# Altium footprint library 3.22-杂项.PcbLib: 985 footprints (part 23 of 64)
Each footprint in its own frame and in the unit in brackets; x right, y up, seen from the top. Pads: shape width x height; smd on the part's side, far side on the other; paste and mask are expansions set on the pad; w line width, h text height; cw(c..) or ccw(c..) is an arc to the next point about the centre after c.
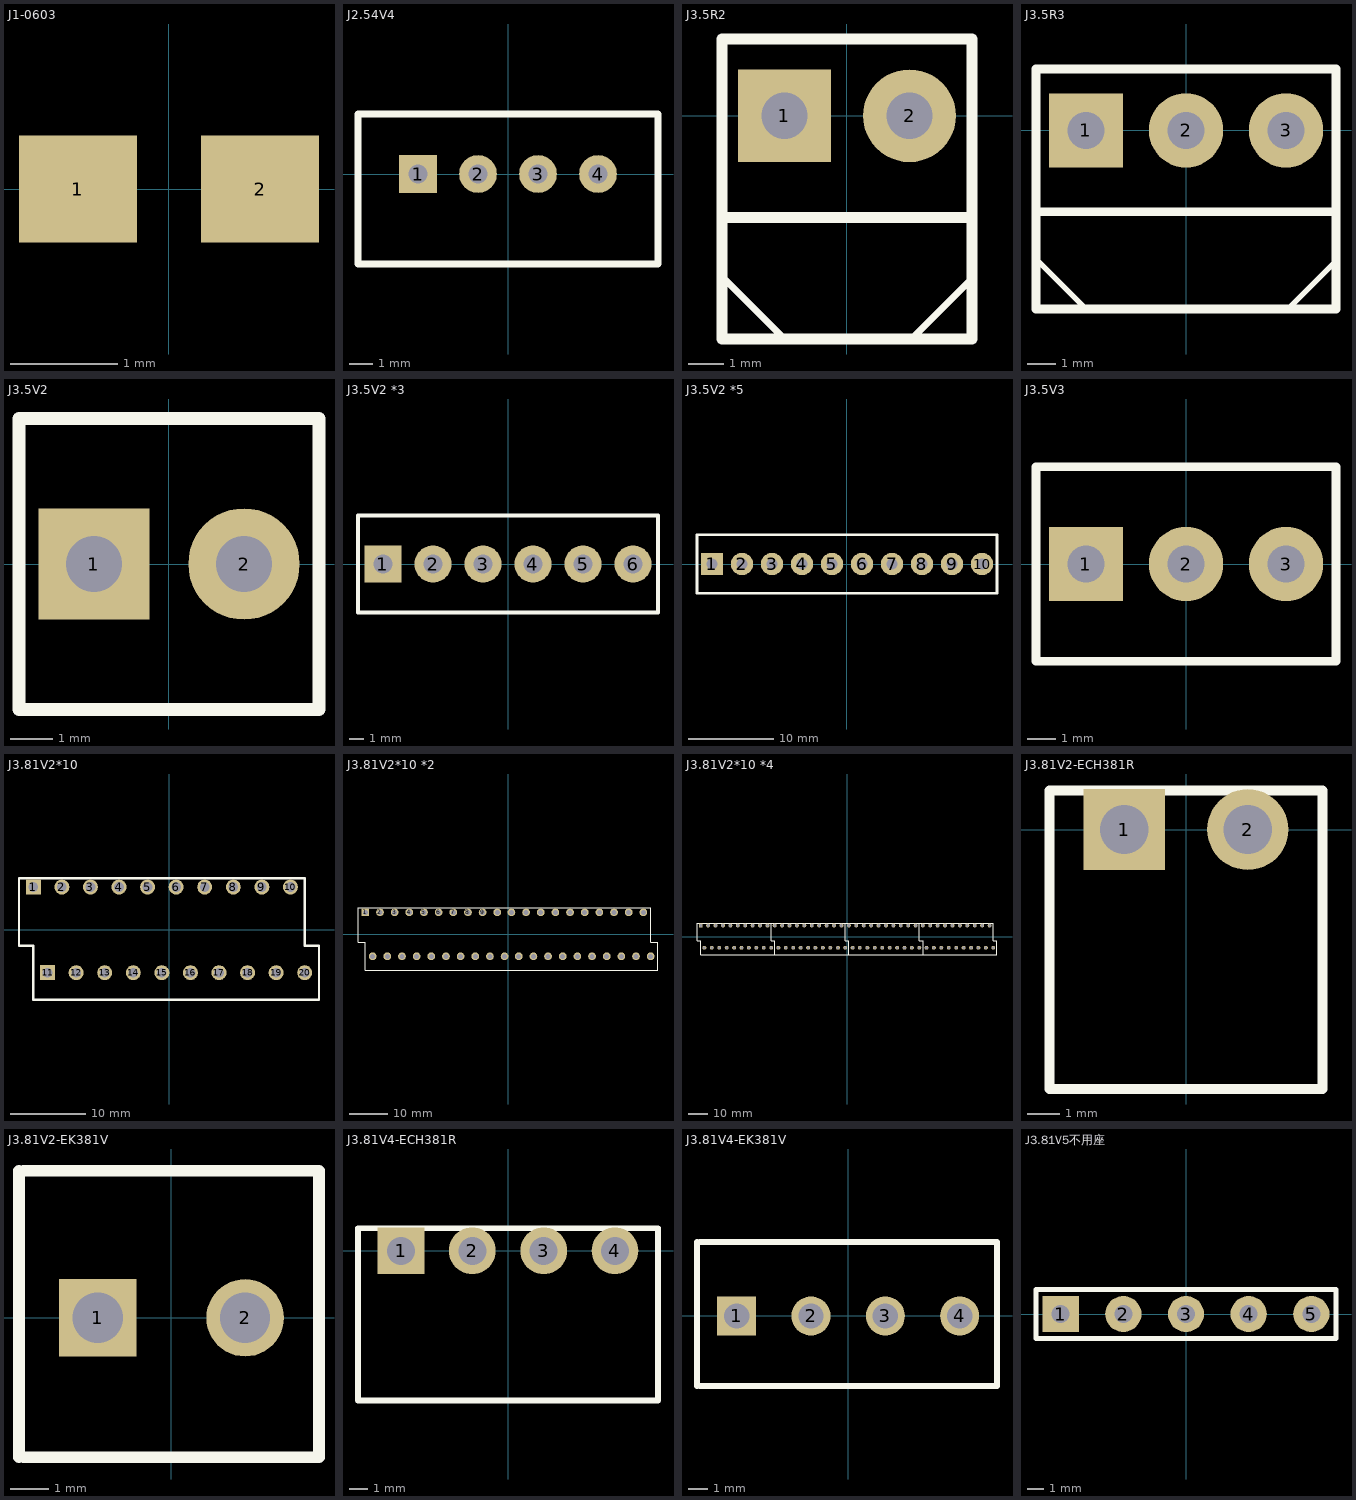
[diagram p22: the footprints below, top view; thin cyan lines are the x and y axes]

## J1-0603 [mm] "Chip Resistor; Body 1.6 x 0.8 mm (LxW typ)"
height 0.6
pads (2):
  rect 1.1x1 smd: 1(-0.85,0) 2(0.85,0)

## J2.54V4 [mm] "2.54间距4芯方针白色插座"
height 0.645
pads (4):
  rect 1.6x1.6 hole 0.8: 1(-3.81,0)
  round 1.6 hole 0.8: 2(-1.27,0) 3(1.27,0) 4(3.81,0)
Top Overlay:
  lines w0.305: -6.35,-3.81 6.35,-3.81 6.35,2.54 -6.35,2.54 -6.35,-3.81

## J3.5R2 [mm] "3.5mm间距2芯方针，直径1.3mm，十字镙丝方向垂直针,宽7mm"
height 8.4
pads (2):
  rect 2.6x2.6 hole 1.3: 1(-1.75,0)
  round 2.6 hole 1.3: 2(1.75,0)
Top Overlay:
  lines w0.2: -3.5,-2.85 -3.5,-4.5 -1.75,-6.25 -1.496,-6.25 ; 1.806,-6.25 3.484,-4.572 3.5,-4.572
  lines w0.305: -3.5,-2.85 3.5,-2.85 ; -3.5,-6.25 3.5,-6.25 3.5,2.15 -3.5,2.15 -3.5,-6.25

## J3.5R3 [mm] "3.5mm间距3芯方针，直径1.3mm，十字镙丝方向垂直针,宽10.5mm"
height 8.4
pads (3):
  rect 2.6x2.6 hole 1.3: 1(-3.5,0)
  round 2.6 hole 1.3: 2(0,0) 3(3.5,0)
Top Overlay:
  lines w0.2: -5.25,-2.85 -5.25,-4.5 -3.5,-6.25 -3.246,-6.25 ; 3.572,-6.25 5.25,-4.572
  lines w0.305: -5.25,-2.85 5.25,-2.85 ; -5.25,-6.25 5.25,-6.25 5.25,2.15 -5.25,2.15 -5.25,-6.25

## J3.5V2 [mm] "3.5mm间距2芯方针，直径1.3mm，镙丝平行针脚方向,宽7mm"
height 8.5
pads (2):
  rect 2.6x2.6 hole 1.3: 1(-1.75,0)
  round 2.6 hole 1.3: 2(1.75,0)
Top Overlay:
  lines w0.305: -3.5,-3.4 -3.5,3.4 3.5,3.4 3.5,-3.4 -3.5,-3.4

## J3.5V2 *3 [mm] ".5mm间距2芯方针，直径1.3mm，镙丝平行针脚方向,宽7mm"
pads (6):
  rect 2.6x2.6 hole 1.3: 1(-8.75,0)
  round 2.6 hole 1.3: 2(-5.25,0) 3(-1.75,0) 4(1.75,0) 5(5.25,0) 6(8.75,0)
Top Overlay:
  lines w0.305: -10.5,-3.4 10.5,-3.4 10.5,3.4 -10.5,3.4 -10.5,-3.4

## J3.5V2 *5 [mm] ".5mm间距2芯方针，直径1.3mm，镙丝平行针脚方向,宽7mm"
pads (10):
  rect 2.6x2.6 hole 1.3: 1(-15.75,0)
  round 2.6 hole 1.3: 2(-12.25,0) 3(-8.75,0) 4(-5.25,0) 5(-1.75,0) 6(1.75,0) 7(5.25,0) 8(8.75,0) 9(12.25,0) 10(15.75,0)
Top Overlay:
  lines w0.305: -17.5,-3.4 -17.5,3.4 17.5,3.4 17.5,-3.4 -17.5,-3.4

## J3.5V3 [mm] "3.5mm间距3芯方针，直径1.3mm，垂直方向镙丝,宽7mm"
pads (3):
  rect 2.6x2.6 hole 1.3: 1(-3.5,0)
  round 2.6 hole 1.3: 2(0,0) 3(3.5,0)
Top Overlay:
  lines w0.305: -5.25,-3.4 5.25,-3.4 5.25,3.4 -5.25,3.4 -5.25,-3.4

## J3.81V2*10 [mm] "前后两排，3.81间距，每排10芯。"
height 26.1
pads (20):
  rect 2x2 hole 1.3: 1(-18.098,5.715) 11(-16.192,-5.715)
  round 2 hole 1.3: 2(-14.287,5.715) 3(-10.477,5.715) 4(-6.667,5.715) 5(-2.857,5.715) 6(0.953,5.715) 7(4.763,5.715) 8(8.572,5.715) 9(12.383,5.715) 10(16.192,5.715) 12(-12.383,-5.715) 13(-8.572,-5.715) 14(-4.763,-5.715) 15(-0.953,-5.715) 16(2.857,-5.715) 17(6.667,-5.715) 18(10.477,-5.715) 19(14.287,-5.715) 20(18.098,-5.715)
Top Overlay:
  lines w0.305: -20.002,-2.115 -18.098,-2.115 -18.098,-9.315 20.002,-9.315 20.002,-2.115 18.098,-2.115 18.098,6.885 -20.002,6.885 -20.002,-2.115

## J3.81V2*10 *2 [mm] "每组前后两排，3.81间距，每排10芯，共2组，即40芯。"
height 26.1
pads (40):
  rect 2x2 hole 1.3: 1(-37.084,5.715)
  round 2 hole 1.3: 2(-33.274,5.715) 3(-29.464,5.715) 4(-25.654,5.715) 5(-21.844,5.715) 6(-18.034,5.715) 7(-14.224,5.715) 8(-10.414,5.715) 9(-6.604,5.715) 10(-2.794,5.715) 11(0.889,5.715) 12(4.699,5.715) 13(8.509,5.715) 14(12.319,5.715) 15(16.129,5.715) 16(19.939,5.715) 17(23.749,5.715) 18(27.559,5.715) 19(31.369,5.715) 20(35.179,5.715) 21(-35.179,-5.715) 22(-31.369,-5.715) 23(-27.559,-5.715) 24(-23.749,-5.715) 25(-19.939,-5.715) 26(-16.129,-5.715) 27(-12.319,-5.715) 28(-8.509,-5.715) 29(-4.699,-5.715) 30(-0.889,-5.715) 31(2.794,-5.715) 32(6.604,-5.715) 33(10.414,-5.715) 34(14.224,-5.715) 35(18.034,-5.715) 36(21.844,-5.715) 37(25.654,-5.715) 38(29.464,-5.715) 39(33.274,-5.715) 40(37.084,-5.715)
Top Overlay:
  lines w0.305: -38.989,-2.115 -37.084,-2.115 -37.084,-9.315 38.989,-9.315 38.989,-2.115 37.084,-2.115 37.084,6.885 -38.989,6.885 -38.989,-2.115

## J3.81V2*10 *4 [mm] "每组前后两排，3.81间距，每排10芯，共4组，即80芯。"
height 26.1
pads (80):
  rect 2x2 hole 1.3: 1(-75.12,5.715)
  round 2 hole 1.3: 2(-71.31,5.715) 3(-67.501,5.715) 4(-63.691,5.715) 5(-59.88,5.715) 6(-56.07,5.715) 7(-52.261,5.715) 8(-48.45,5.715) 9(-44.64,5.715) 10(-40.831,5.715) 11(-37.148,5.715) 12(-33.337,5.715) 13(-29.527,5.715) 14(-25.717,5.715) 15(-21.907,5.715) 16(-18.098,5.715) 17(-14.287,5.715) 18(-10.477,5.715) 19(-6.667,5.715) 20(-2.857,5.715) 21(0.953,5.715) 22(4.763,5.715) 23(8.572,5.715) 24(12.383,5.715) 25(16.192,5.715) 26(20.002,5.715) 27(23.812,5.715) 28(27.622,5.715) 29(31.432,5.715) 30(35.242,5.715) 31(38.925,5.715) 32(42.735,5.715) 33(46.545,5.715) 34(50.355,5.715) 35(54.165,5.715) 36(57.975,5.715) 37(61.785,5.715) 38(65.596,5.715) 39(69.406,5.715) 40(73.215,5.715) 41(-73.215,-5.715) 42(-69.406,-5.715) 43(-65.596,-5.715) 44(-61.785,-5.715) 45(-57.975,-5.715) 46(-54.165,-5.715) 47(-50.355,-5.715) 48(-46.545,-5.715) 49(-42.735,-5.715) 50(-38.925,-5.715) 51(-35.242,-5.715) 52(-31.432,-5.715) 53(-27.622,-5.715) 54(-23.812,-5.715) 55(-20.002,-5.715) 56(-16.192,-5.715) 57(-12.383,-5.715) 58(-8.572,-5.715) 59(-4.635,-5.715) 60(-0.953,-5.715) 61(2.857,-5.715) 62(6.54,-5.715) 63(10.477,-5.715) 64(14.287,-5.715) 65(18.098,-5.715) 66(21.907,-5.715) 67(25.717,-5.715) 68(29.527,-5.715) 69(33.337,-5.715) 70(37.148,-5.715) 71(40.831,-5.715) 72(44.64,-5.715) 73(48.45,-5.715) 74(52.261,-5.715) 75(56.07,-5.715) 76(59.88,-5.715) 77(63.691,-5.715) 78(67.501,-5.715) 79(71.31,-5.715) 80(75.12,-5.715)
Top Overlay:
  lines w0.305: -38.925,6.885 -38.925,-2.115 -37.02,-2.115 -37.02,-9.315 ; -0.953,6.885 -0.953,-2.115 0.953,-2.115 0.953,-9.315 ; 37.148,6.885 37.148,-2.115 39.052,-2.115 39.052,-9.315 ; 0.953,-9.315 -75.12,-9.315 -75.12,-2.115 -77.025,-2.115 -77.025,6.885 75.12,6.885 75.12,-2.115 77.025,-2.115 77.025,-9.315 0.953,-9.315

## J3.81V2-ECH381R [mm] "1排，3.81间距，2芯，不带镙丝可插拔，ECH381R"
height 7
pads (2):
  rect 2.5x2.5 hole 1.5: 1(-1.905,0)
  round 2.5 hole 1.5: 2(1.905,0)
Top Overlay:
  lines w0.305: -4.205,-8 -4.205,1.2 4.205,1.2 4.205,-8 -4.205,-8

## J3.81V2-EK381V [mm] "1排，3.81间距，2芯，不可插拔"
height 8.5
pads (2):
  rect 2x2 hole 1.3: 1(-1.905,0)
  round 2 hole 1.3: 2(1.905,0)
Top Overlay:
  lines w0.305: -3.937,-3.6 -3.937,3.8 ; -3.815,-3.6 3.815,-3.6 3.815,3.8 -3.815,3.8

## J3.81V4-ECH381R [mm] "1排，3.81间距，4芯，不带镙丝可插拔，ECH381R"
height 7
pads (4):
  rect 2.5x2.5 hole 1.5: 1(-5.715,0)
  round 2.5 hole 1.5: 2(-1.905,0) 3(1.905,0) 4(5.715,0)
Top Overlay:
  lines w0.305: -8.015,-8 -8.015,1.2 8.015,1.2 8.015,-8 -8.015,-8

## J3.81V4-EK381V [mm] "1排，3.81间距，4芯，不可插拔，EK381V"
height 8.5
pads (4):
  rect 2x2 hole 1.3: 1(-5.715,0)
  round 2 hole 1.3: 2(-1.905,0) 3(1.905,0) 4(5.715,0)
Top Overlay:
  lines w0.305: -7.747,-3.6 -7.747,3.8 ; -7.625,-3.6 7.625,-3.6 7.625,3.8 -7.625,3.8

## J3.81V5不用座 [mm] "1排，3.81间距，5芯，不用座，只手将线焊在板上临时用"
height 8.5
pads (5):
  rect 2.2x2.2 hole 1.1: 1(-7.62,0)
  round 2.2 hole 1.1: 2(-3.81,0) 3(0,0) 4(3.81,0) 5(7.62,0)
Top Overlay:
  lines w0.305: -9.12,-1.5 -9.12,1.5 9.12,1.5 9.12,-1.5 -9.12,-1.5